# Altium footprint library THD Opto Components.PcbLib: 30 footprints (part 2 of 2)
Each footprint in its own frame and in the unit in brackets; x right, y up, seen from the top. Pads: shape width x height; smd on the part's side, far side on the other; paste and mask are expansions set on the pad; w line width, h text height; cw(c..) or ccw(c..) is an arc to the next point about the centre after c.
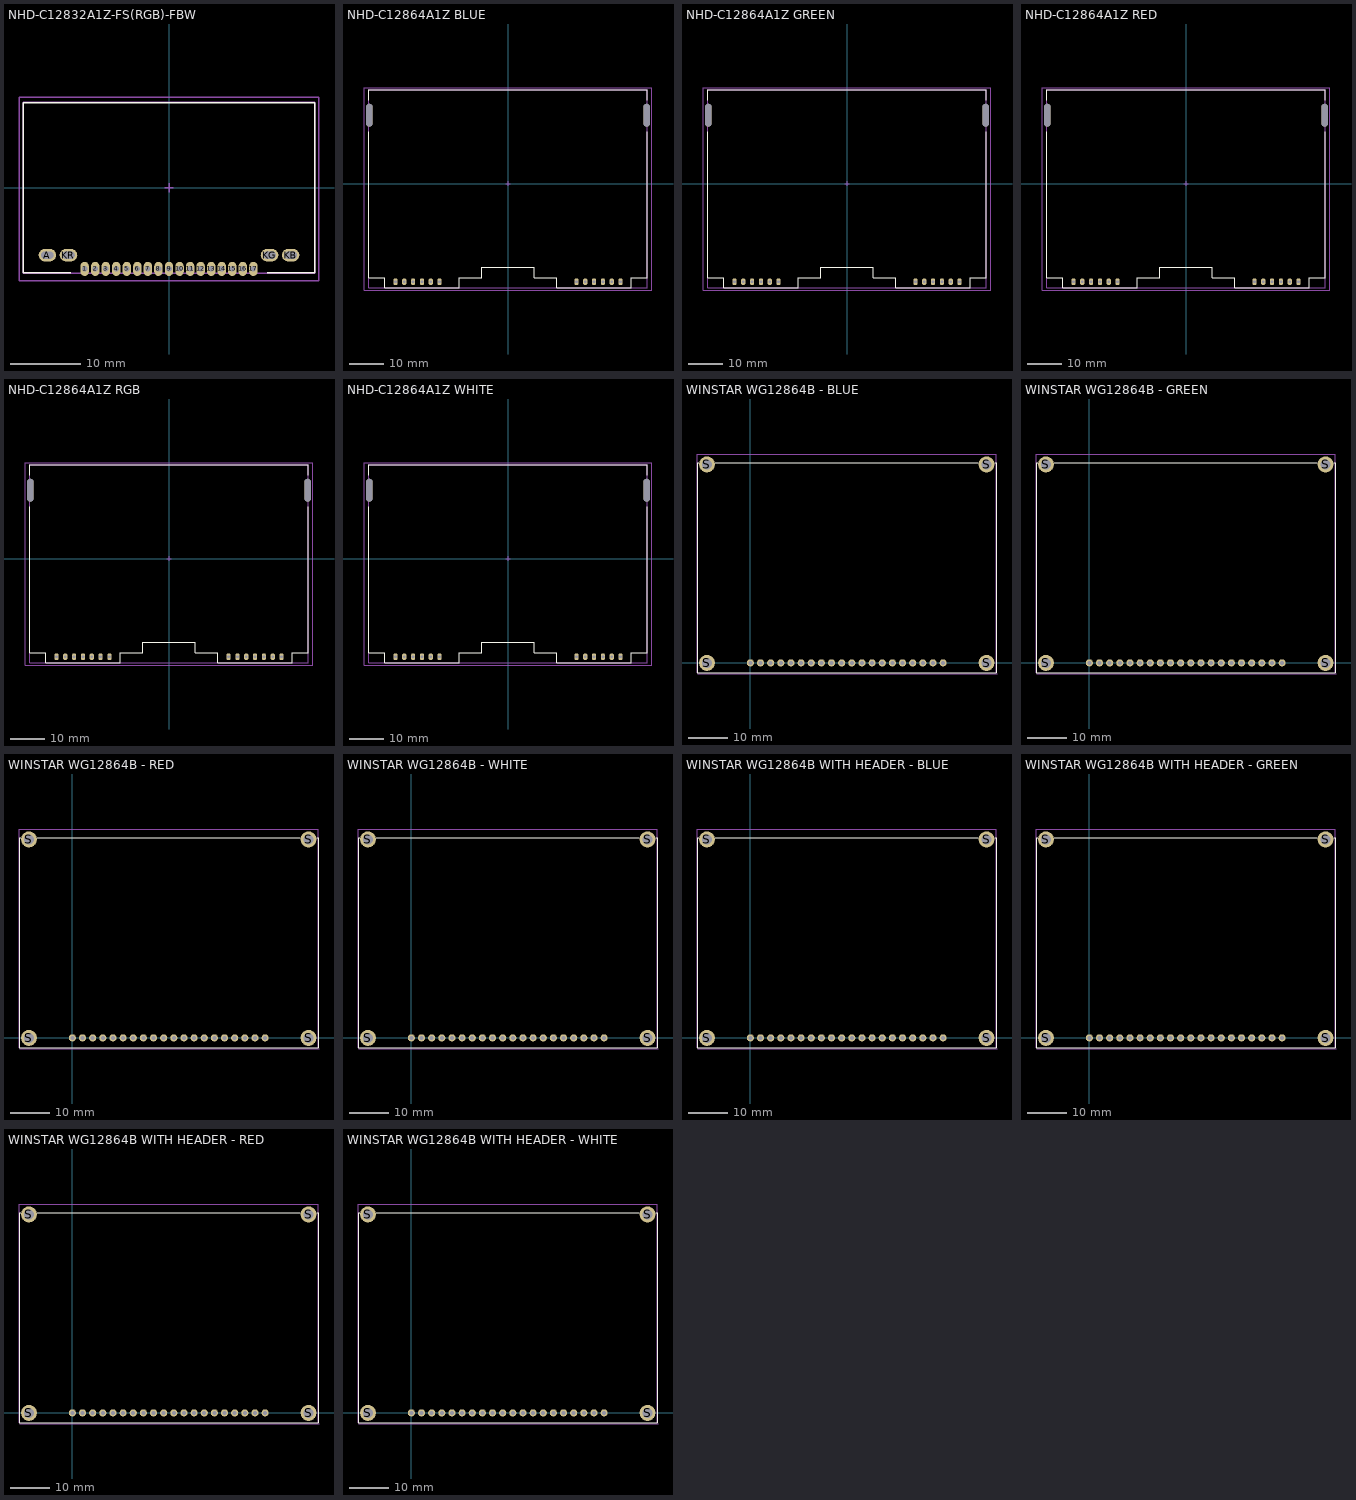
[diagram p1: the footprints below, top view; thin cyan lines are the x and y axes]

## NHD-C12832A1Z-FS(RGB)-FBW [mm]
height 6.4
pads (21):
  oval 1.2x2 hole 0.8: 1(-12,-11.55) 2(-10.5,-11.55) 3(-9,-11.55) 4(-7.5,-11.55) 5(-6,-11.55) 6(-4.5,-11.55) 7(-3,-11.55) 8(-1.5,-11.55) 9(0,-11.55) 10(1.5,-11.55) 11(3,-11.55) 12(4.5,-11.55) 13(6,-11.55) 14(7.5,-11.55) 15(9,-11.55) 16(10.5,-11.55) 17(12,-11.55)
  oval 2.5x1.75 hole 1 slot 1.75 at 0 deg: A(-17.3,-9.6) KB(17.3,-9.6) KG(14.3,-9.6) KR(-14.3,-9.6)
Top Overlay:
  lines w0.2: -14,-12.1 -20.7,-12.1 -20.7,12.1 0,12.1 20.7,12.1 20.7,-12.1 14,-12.1
Mechanical 13:
  lines w0.2: -20.7,-12.15 -20.7,12.15 20.7,12.15 20.7,-12.15 -20.7,-12.15
Mechanical 15:
  lines w0.2: -0.635,0 0.635,0 ; 0,-0.635 0,0.635 ; -21.336,-13.208 21.336,-13.208 21.336,12.827 -21.336,12.827 -21.336,-13.208
3D body "NHD-C12832A1Z-FSRGB.STEP": height 4.9, standoff -2.1, extent -20.7,-12.15 20.7,12.15

## NHD-C12864A1Z BLUE [mm]
height 7
pads (14):
  oval 1.2x2 hole 0.8: 1(-32.38,-28.2) 2(-29.84,-28.2) 3(-27.3,-28.2) 4(-24.76,-28.2) 5(-22.22,-28.2) 6(-19.68,-28.2) 7(19.68,-28.2) 8(22.22,-28.2) 9(24.76,-28.2) 10(27.3,-28.2) 11(29.84,-28.2) 12(32.38,-28.2)
  oval 1.8x6.5 hole 1.8 slot 6.5 at 90 deg unplated: M(-39.9,19.7) M(39.9,19.7)
Top Overlay:
  lines w0.2: -40,15 -40,-27 -35.5,-27 -35.5,-30 -14,-30 -14,-27 -7.5,-27 -7.5,-24 0,-24 7.5,-24 7.5,-27 14,-27 14,-30 35.5,-30 35.5,-27 40,-27 40,15 ; -40,24 -40,27 0,27 40,27 40,24
Mechanical 13:
  lines w0.2: -40,-30 40,-30 40,27 -40,27 -40,-30
Mechanical 15:
  lines w0.2: -0.635,0 0.635,0 ; 0,-0.635 0,0.635 ; -41.402,-30.607 41.402,-30.607 41.402,27.559 -41.402,27.559 -41.402,-30.607
3D body "NHD-C12864A1Z BLUE.STEP": height 7, standoff -6.6, extent -40,-30 40,27

## NHD-C12864A1Z GREEN [mm]
height 7
pads (14):
  oval 1.2x2 hole 0.8: 1(-32.38,-28.2) 2(-29.84,-28.2) 3(-27.3,-28.2) 4(-24.76,-28.2) 5(-22.22,-28.2) 6(-19.68,-28.2) 7(19.68,-28.2) 8(22.22,-28.2) 9(24.76,-28.2) 10(27.3,-28.2) 11(29.84,-28.2) 12(32.38,-28.2)
  oval 1.8x6.5 hole 1.8 slot 6.5 at 90 deg unplated: M(-39.9,19.7) M(39.9,19.7)
Top Overlay:
  lines w0.2: -40,15 -40,-27 -35.5,-27 -35.5,-30 -14,-30 -14,-27 -7.5,-27 -7.5,-24 0,-24 7.5,-24 7.5,-27 14,-27 14,-30 35.5,-30 35.5,-27 40,-27 40,15 ; -40,24 -40,27 0,27 40,27 40,24
Mechanical 13:
  lines w0.2: -40,-30 40,-30 40,27 -40,27 -40,-30
Mechanical 15:
  lines w0.2: -0.635,0 0.635,0 ; 0,-0.635 0,0.635 ; -41.402,-30.607 41.402,-30.607 41.402,27.559 -41.402,27.559 -41.402,-30.607
3D body "NHD-C12864A1Z GREEN.STEP": height 7, standoff -6.6, extent -40,-30 40,27

## NHD-C12864A1Z RED [mm]
height 7
pads (14):
  oval 1.2x2 hole 0.8: 1(-32.38,-28.2) 2(-29.84,-28.2) 3(-27.3,-28.2) 4(-24.76,-28.2) 5(-22.22,-28.2) 6(-19.68,-28.2) 7(19.68,-28.2) 8(22.22,-28.2) 9(24.76,-28.2) 10(27.3,-28.2) 11(29.84,-28.2) 12(32.38,-28.2)
  oval 1.8x6.5 hole 1.8 slot 6.5 at 90 deg unplated: M(-39.9,19.7) M(39.9,19.7)
Top Overlay:
  lines w0.2: -40,15 -40,-27 -35.5,-27 -35.5,-30 -14,-30 -14,-27 -7.5,-27 -7.5,-24 0,-24 7.5,-24 7.5,-27 14,-27 14,-30 35.5,-30 35.5,-27 40,-27 40,15 ; -40,24 -40,27 0,27 40,27 40,24
Mechanical 13:
  lines w0.2: -40,-30 -40,27 40,27 40,-30 -40,-30
Mechanical 15:
  lines w0.2: -0.635,0 0.635,0 ; 0,-0.635 0,0.635 ; -41.402,-30.607 -41.402,27.559 41.402,27.559 41.402,-30.607 -41.402,-30.607
3D body "NHD-C12864A1Z RED.STEP": height 7, standoff -6.6, extent -40,-30 40,27

## NHD-C12864A1Z RGB [mm]
height 7
pads (16):
  oval 1.2x2 hole 0.8: 1(-32.38,-28.2) 2(-29.84,-28.2) 3(-27.3,-28.2) 4(-24.76,-28.2) 5(-22.22,-28.2) 6(-19.68,-28.2) 7(-17.14,-28.2) 8(17.14,-28.2) 9(19.68,-28.2) 10(22.22,-28.2) 11(24.76,-28.2) 12(27.3,-28.2) 13(29.84,-28.2) 14(32.38,-28.2)
  oval 1.8x6.5 hole 1.8 slot 6.5 at 90 deg unplated: M(-39.9,19.7) M(39.9,19.7)
Top Overlay:
  lines w0.2: -40,15 -40,-27 -35.5,-27 -35.5,-30 -14,-30 -14,-27 -7.5,-27 -7.5,-24 0,-24 7.5,-24 7.5,-27 14,-27 14,-30 35.5,-30 35.5,-27 40,-27 40,15 ; -40,24 -40,27 0,27 40,27 40,24
Mechanical 13:
  lines w0.2: -40,-30 40,-30 40,27 -40,27 -40,-30
Mechanical 15:
  lines w0.2: -0.635,0 0.635,0 ; 0,-0.635 0,0.635 ; -41.402,-30.607 41.402,-30.607 41.402,27.559 -41.402,27.559 -41.402,-30.607
3D body "NHD-C12864A1Z RGB.STEP": height 7, standoff -6.6, extent -40,-30 40,27

## NHD-C12864A1Z WHITE [mm]
height 7
pads (14):
  oval 1.2x2 hole 0.8: 1(-32.38,-28.2) 2(-29.84,-28.2) 3(-27.3,-28.2) 4(-24.76,-28.2) 5(-22.22,-28.2) 6(-19.68,-28.2) 7(19.68,-28.2) 8(22.22,-28.2) 9(24.76,-28.2) 10(27.3,-28.2) 11(29.84,-28.2) 12(32.38,-28.2)
  oval 1.8x6.5 hole 1.8 slot 6.5 at 90 deg unplated: M(-39.9,19.7) M(39.9,19.7)
Top Overlay:
  lines w0.2: -40,15 -40,-27 -35.5,-27 -35.5,-30 -14,-30 -14,-27 -7.5,-27 -7.5,-24 0,-24 7.5,-24 7.5,-27 14,-27 14,-30 35.5,-30 35.5,-27 40,-27 40,15 ; -40,24 -40,27 0,27 40,27 40,24
Mechanical 13:
  lines w0.2: -40,-30 -40,27 40,27 40,-30 -40,-30
Mechanical 15:
  lines w0.2: -0.635,0 0.635,0 ; 0,-0.635 0,0.635 ; -41.402,-30.607 -41.402,27.559 41.402,27.559 41.402,-30.607 -41.402,-30.607
3D body "NHD-C12864A1Z WHITE.STEP": height 7, standoff -6.6, extent -40,-30 40,27

## WINSTAR WG12864B - BLUE [mm]
pads (24):
  round 1.8 hole 1: 1(0,0) 2(2.54,0) 3(5.08,0) 4(7.62,0) 5(10.16,0) 6(12.7,0) 7(15.24,0) 8(17.78,0) 9(20.32,0) 10(22.86,0) 11(25.4,0) 12(27.94,0) 13(30.48,0) 14(33.02,0) 15(35.56,0) 16(38.1,0) 17(40.64,0) 18(43.18,0) 19(45.72,0) 20(48.26,0)
  round 4 hole 2.5: S(-10.87,0) S(-10.87,49.7) S(59.13,0) S(59.13,49.7)
Top Overlay:
  lines w0.254: -13.37,-2.5 61.63,-2.5 61.63,50.165 61.214,50.165 ; -13.37,50.165 -12.954,50.165 ; -13.335,-2.5 -13.335,50.165 ; -8.763,50.165 57.023,50.165
Mechanical 15:
  lines w0.254: -13.37,-2.5 -13.37,52.197 61.63,52.197 61.63,-2.5 ; -13.243,-2.667 61.757,-2.667
3D body "WINSTAR WG12864B - Blue.step": height 9.1, standoff 0.16, extent -13.37,-2.497 61.63,50.203

## WINSTAR WG12864B - GREEN [mm]
pads (24):
  round 1.8 hole 1: 1(0,0) 2(2.54,0) 3(5.08,0) 4(7.62,0) 5(10.16,0) 6(12.7,0) 7(15.24,0) 8(17.78,0) 9(20.32,0) 10(22.86,0) 11(25.4,0) 12(27.94,0) 13(30.48,0) 14(33.02,0) 15(35.56,0) 16(38.1,0) 17(40.64,0) 18(43.18,0) 19(45.72,0) 20(48.26,0)
  round 4 hole 2.5: S(-10.87,0) S(-10.87,49.7) S(59.13,0) S(59.13,49.7)
Top Overlay:
  lines w0.254: -13.37,-2.5 61.63,-2.5 61.63,50.165 61.214,50.165 ; -13.37,50.165 -12.954,50.165 ; -13.335,-2.5 -13.335,50.165 ; -8.763,50.165 57.023,50.165
Mechanical 15:
  lines w0.254: -13.37,-2.5 -13.37,52.197 61.63,52.197 61.63,-2.5 ; -13.243,-2.667 61.757,-2.667
3D body "WINSTAR WG12864B - Green.step": height 9.1, standoff 0.16, extent -13.37,-2.497 61.63,50.203

## WINSTAR WG12864B - RED [mm]
pads (24):
  round 1.8 hole 1: 1(0,0) 2(2.54,0) 3(5.08,0) 4(7.62,0) 5(10.16,0) 6(12.7,0) 7(15.24,0) 8(17.78,0) 9(20.32,0) 10(22.86,0) 11(25.4,0) 12(27.94,0) 13(30.48,0) 14(33.02,0) 15(35.56,0) 16(38.1,0) 17(40.64,0) 18(43.18,0) 19(45.72,0) 20(48.26,0)
  round 4 hole 2.5: S(-10.87,0) S(-10.87,49.7) S(59.13,0) S(59.13,49.7)
Top Overlay:
  lines w0.254: -13.37,-2.5 61.63,-2.5 61.63,50.165 61.214,50.165 ; -13.37,50.165 -12.954,50.165 ; -13.335,-2.5 -13.335,50.165 ; -8.763,50.165 57.023,50.165
Mechanical 15:
  lines w0.254: -13.37,-2.5 -13.37,52.197 61.63,52.197 61.63,-2.5 ; -13.243,-2.667 61.757,-2.667
3D body "WINSTAR WG12864B - Red.step": height 9.1, standoff 0.16, extent -13.37,-2.497 61.63,50.203

## WINSTAR WG12864B - WHITE [mm]
pads (24):
  round 1.8 hole 1: 1(0,0) 2(2.54,0) 3(5.08,0) 4(7.62,0) 5(10.16,0) 6(12.7,0) 7(15.24,0) 8(17.78,0) 9(20.32,0) 10(22.86,0) 11(25.4,0) 12(27.94,0) 13(30.48,0) 14(33.02,0) 15(35.56,0) 16(38.1,0) 17(40.64,0) 18(43.18,0) 19(45.72,0) 20(48.26,0)
  round 4 hole 2.5: S(-10.87,0) S(-10.87,49.7) S(59.13,0) S(59.13,49.7)
Top Overlay:
  lines w0.254: -13.37,-2.5 61.63,-2.5 61.63,50.165 61.214,50.165 ; -13.37,50.165 -12.954,50.165 ; -13.335,-2.5 -13.335,50.165 ; -8.763,50.165 57.023,50.165
Mechanical 15:
  lines w0.254: -13.37,-2.5 -13.37,52.197 61.63,52.197 61.63,-2.5 ; -13.243,-2.667 61.757,-2.667
3D body "WINSTAR WG12864B - White.step": height 9.1, standoff 0.16, extent -13.37,-2.497 61.63,50.203

## WINSTAR WG12864B WITH HEADER - BLUE [mm]
pads (24):
  round 1.8 hole 1: 1(0,0) 2(2.54,0) 3(5.08,0) 4(7.62,0) 5(10.16,0) 6(12.7,0) 7(15.24,0) 8(17.78,0) 9(20.32,0) 10(22.86,0) 11(25.4,0) 12(27.94,0) 13(30.48,0) 14(33.02,0) 15(35.56,0) 16(38.1,0) 17(40.64,0) 18(43.18,0) 19(45.72,0) 20(48.26,0)
  round 4 hole 2.5: S(-10.87,0) S(-10.87,49.7) S(59.13,0) S(59.13,49.7)
Top Overlay:
  lines w0.254: -13.37,-2.5 61.63,-2.5 61.63,50.165 61.214,50.165 ; -13.37,50.165 -12.954,50.165 ; -13.335,-2.5 -13.335,50.165 ; -8.763,50.165 57.023,50.165
Mechanical 15:
  lines w0.254: -13.37,-2.5 -13.37,52.197 61.63,52.197 61.63,-2.5 ; -13.243,-2.667 61.757,-2.667
3D body "WINSTAR WG12864B With Header - Blue.step": height 9.1, standoff -6.37, extent -13.37,-2.497 61.63,50.203

## WINSTAR WG12864B WITH HEADER - GREEN [mm]
pads (24):
  round 1.8 hole 1: 1(0,0) 2(2.54,0) 3(5.08,0) 4(7.62,0) 5(10.16,0) 6(12.7,0) 7(15.24,0) 8(17.78,0) 9(20.32,0) 10(22.86,0) 11(25.4,0) 12(27.94,0) 13(30.48,0) 14(33.02,0) 15(35.56,0) 16(38.1,0) 17(40.64,0) 18(43.18,0) 19(45.72,0) 20(48.26,0)
  round 4 hole 2.5: S(-10.87,0) S(-10.87,49.7) S(59.13,0) S(59.13,49.7)
Top Overlay:
  lines w0.254: -13.37,-2.5 61.63,-2.5 61.63,50.165 61.214,50.165 ; -13.37,50.165 -12.954,50.165 ; -13.335,-2.5 -13.335,50.165 ; -8.763,50.165 57.023,50.165
Mechanical 15:
  lines w0.254: -13.37,-2.5 -13.37,52.197 61.63,52.197 61.63,-2.5 ; -13.243,-2.667 61.757,-2.667
3D body "WINSTAR WG12864B With Header - Green.step": height 9.1, standoff -6.37, extent -13.37,-2.497 61.63,50.203

## WINSTAR WG12864B WITH HEADER - RED [mm]
pads (24):
  round 1.8 hole 1: 1(0,0) 2(2.54,0) 3(5.08,0) 4(7.62,0) 5(10.16,0) 6(12.7,0) 7(15.24,0) 8(17.78,0) 9(20.32,0) 10(22.86,0) 11(25.4,0) 12(27.94,0) 13(30.48,0) 14(33.02,0) 15(35.56,0) 16(38.1,0) 17(40.64,0) 18(43.18,0) 19(45.72,0) 20(48.26,0)
  round 4 hole 2.5: S(-10.87,0) S(-10.87,49.7) S(59.13,0) S(59.13,49.7)
Top Overlay:
  lines w0.254: -13.37,-2.5 61.63,-2.5 61.63,50.165 61.214,50.165 ; -13.37,50.165 -12.954,50.165 ; -13.335,-2.5 -13.335,50.165 ; -8.763,50.165 57.023,50.165
Mechanical 15:
  lines w0.254: -13.37,-2.5 -13.37,52.197 61.63,52.197 61.63,-2.5 ; -13.243,-2.667 61.757,-2.667
3D body "WINSTAR WG12864B With Header - Red.step": height 9.1, standoff -6.37, extent -13.37,-2.497 61.63,50.203

## WINSTAR WG12864B WITH HEADER - WHITE [mm]
pads (24):
  round 1.8 hole 1: 1(0,0) 2(2.54,0) 3(5.08,0) 4(7.62,0) 5(10.16,0) 6(12.7,0) 7(15.24,0) 8(17.78,0) 9(20.32,0) 10(22.86,0) 11(25.4,0) 12(27.94,0) 13(30.48,0) 14(33.02,0) 15(35.56,0) 16(38.1,0) 17(40.64,0) 18(43.18,0) 19(45.72,0) 20(48.26,0)
  round 4 hole 2.5: S(-10.87,0) S(-10.87,49.7) S(59.13,0) S(59.13,49.7)
Top Overlay:
  lines w0.254: -13.37,-2.5 61.63,-2.5 61.63,50.165 61.214,50.165 ; -13.37,50.165 -12.954,50.165 ; -13.335,-2.5 -13.335,50.165 ; -8.763,50.165 57.023,50.165
Mechanical 15:
  lines w0.254: -13.37,-2.5 -13.37,52.197 61.63,52.197 61.63,-2.5 ; -13.243,-2.667 61.757,-2.667
3D body "WINSTAR WG12864B With Header - White.step": height 9.1, standoff -6.37, extent -13.37,-2.497 61.63,50.203